# Altium footprint library PcbLib1.PcbLib: 17 footprints (part 2 of 2)
Each footprint in its own frame and in the unit in brackets; x right, y up, seen from the top. Pads: shape width x height; smd on the part's side, far side on the other; paste and mask are expansions set on the pad; w line width, h text height; cw(c..) or ccw(c..) is an arc to the next point about the centre after c.
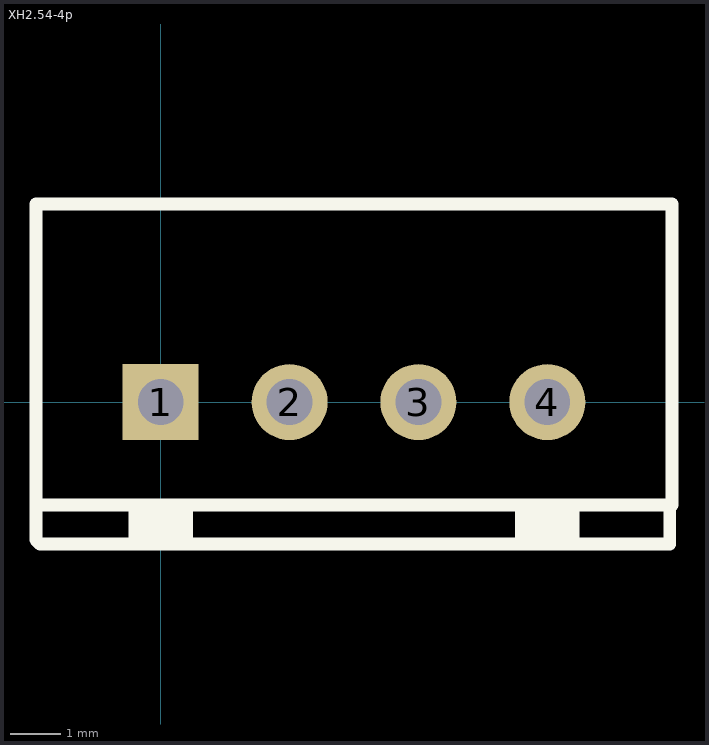
[diagram p1: the footprint, top view; thin cyan lines are the x and y axes]

## XH2.54-4p [mm]
pads (4):
  rect 1.5x1.5 hole 0.9: 1(0,0)
  round 1.5 hole 0.9: 2(2.54,0) 3(5.08,0) 4(7.62,0)
Top Overlay:
  rectangle: -0.635,-2.794 0.635,-2.032
  rectangle: 6.985,-2.794 8.255,-2.032
  lines w0.254: 10.033,-2.079 10.033,-2.794 -2.38,-2.794 -2.46,-2.714 -2.46,-2.032 ; -2.46,-2.032 -2.46,3.9 10.08,3.9 10.08,-2.032 -2.46,-2.032